# Altium footprint library SMotlaq-PCB_lib.PcbLib: 186 footprints (part 2 of 12)
Each footprint in its own frame and in the unit in brackets; x right, y up, seen from the top. Pads: shape width x height; smd on the part's side, far side on the other; paste and mask are expansions set on the pad; w line width, h text height; cw(c..) or ccw(c..) is an arc to the next point about the centre after c.
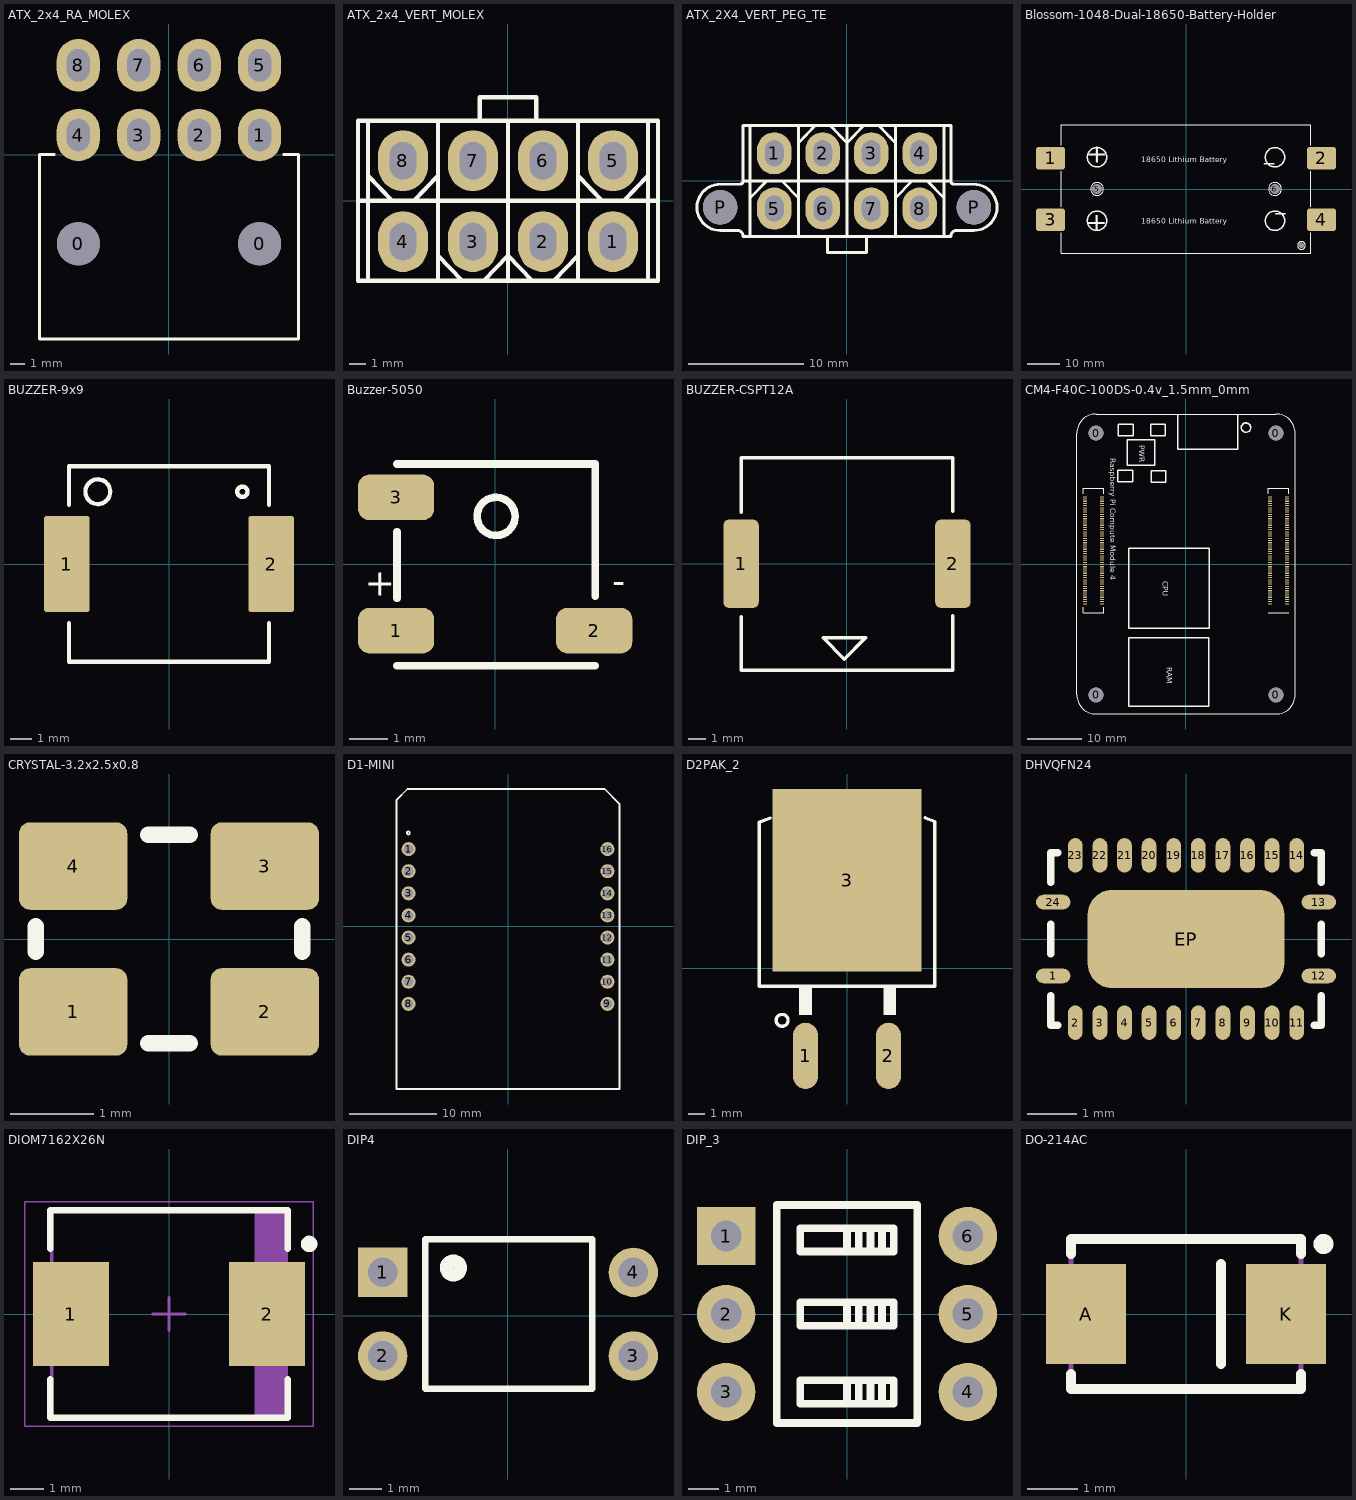
[diagram p1: the footprints below, top view; thin cyan lines are the x and y axes]

## ATX_2x4_RA_MOLEX [mm] "26013144   Mini-Fit Jr. Header, Dual Row, Right-Angle, with Snap-in Plastic Peg PCB Lock, 8 Circuits, PA Polyamide Nylon 6/6 94V-2, 1.27µm Select Gold (Au) Plating"
pads (10):
  round 3 hole 3 mask+0.05: 0(-6.299,-6.202) 0(6.301,-6.202)
  oval 3x3.65 hole 1.6 slot 2.25 at 90 deg: 1(6.299,1.352) 2(2.099,1.352) 3(-2.101,1.352) 4(-6.301,1.352) 5(6.299,6.202) 6(2.099,6.202) 7(-2.101,6.202) 8(-6.301,6.202)
Top Overlay:
  lines w0.2: -7.975,-0.002 -8.999,-0.002 -8.999,-12.821 9.001,-12.821 9.001,-0.002 7.976,-0.002
3D body "026013144.STEP": height 11.4, standoff -3.6, extent -8.999,-12.802 9.401,7.133

## ATX_2x4_VERT_MOLEX [mm] "26013144   Mini-Fit Jr. Header, Dual Row, Vertical, with Snap-in Plastic Peg PCB Lock, 8 Circuits, PA Polyamide Nylon 6/6 94V-2, 1.27µm Select Gold (Au) Plating"
pads (8):
  oval 3x3.65 hole 1.6 slot 2.25 at 90 deg: 1(6.3,-2.455) 2(2.1,-2.455) 3(-2.1,-2.455) 4(-6.3,-2.455) 5(6.3,2.395) 6(2.1,2.395) 7(-2.1,2.395) 8(-6.3,2.395)
Top Overlay:
  lines w0.254: -9,0 9,0 ; -8.4,-4.8 -8.4,4.8 ; -8.396,1.493 -6.961,0.006 ; -5.639,0.006 -4.204,1.493 ; -4.2,-4.8 -4.2,4.8 ; -4.199,-3.295 -2.752,-4.794 ; -1.7,4.8 -1.7,6.2 1.7,6.2 1.7,4.8 ; -1.448,-4.794 -0.001,-3.295 ; 0,-4.8 0,4.8 ; 0.001,-3.295 1.448,-4.794 ; 2.752,-4.794 4.199,-3.295 ; 4.2,-4.8 4.2,4.8 ; 4.204,1.493 5.639,0.006 ; 6.961,0.006 8.396,1.493 ; 8.4,-4.8 8.4,4.8 ; -9,-4.8 -9,4.8 9,4.8 9,-4.8 -9,-4.8
3D body "039281083.STEP": height 12.81, standoff -3.49, extent -9.4,-5 9.4,6

## ATX_2X4_VERT_PEG_TE [mm]
height 12.8
pads (10):
  oval 3x3.65 hole 1.6 slot 2.25 at 90 deg: 1(-6.3,2.395) 2(-2.1,2.395) 3(2.1,2.395) 4(6.3,2.395) 5(-6.3,-2.395) 6(-2.1,-2.395) 7(2.1,-2.395) 8(6.3,-2.395)
  round 3 hole 3 unplated mask+0.1: P(-11,-2.29) P(11,-2.29)
Top Overlay:
  lines w0.2: -9,0 -9,0 ; 9,0 9,0
  lines w0.254: -9,-4.8 4.2,-4.8 ; -9,-4.8 ccw(c-9.51,-4.8) -9.51,-4.29 -11,-4.29 cw(c-11,-2.29) -11,-0.29 -9.29,-0.29 ccw(c-9.29,0) -9,0 ; -8.4,-4.8 -8.4,4.8 ; -8.396,-1.493 -6.961,-0.006 ; -5.639,-0.006 -4.204,-1.493 ; -4.2,-4.8 -4.2,4.8 ; -4.199,3.295 -2.752,4.794 ; -1.7,-4.8 -1.7,-6.2 1.7,-6.2 1.7,-4.8 ; -1.448,4.794 -0.001,3.295 ; 0,-4.8 0,4.8 ; 0.001,3.295 1.448,4.794 ; 2.752,4.794 4.199,3.295 ; 4.2,4.8 4.2,-4.8 ; 4.204,-1.493 5.639,-0.006 ; 6.961,-0.006 8.396,-1.493 ; 8.4,-4.8 8.4,4.8 ; 4.2,-4.8 9,-4.8 cw(c9.51,-4.8) 9.51,-4.29 11,-4.29 ccw(c11,-2.29) 11,-0.29 9.29,-0.29 cw(c9.29,0) 9,0 ; 9,0 -9,0 -9,4.8 9,4.8 9,0
3D body "c-1586039-8-b-3d.stp": height 13, standoff -3.3, extent -12.15,-6.075 12.15,4.875

## Blossom-1048-Dual-18650-Battery-Holder [mm]
pads (7):
  rrect25% 9x7 smd: 1(-42.03,9.555) 2(42.03,9.555) 3(-42.03,-9.555) 4(42.03,-9.555)
  round 3 hole 3: 5(-27.6,0) 6(27.6,0)
  round 1.7 hole 1.7: 11(35.8,-17.5)
Top Overlay:
  circle w0.254: c-27.6,0 r2
  circle w0.254: c27.6,0 r2
  circle w0.254: c35.8,-17.5 r1.2
  circle w0.5: c-27.6,9.85 r3
  circle w0.5: c-27.6,-9.85 r3
  circle w0.5: c27.6,9.85 r3
  circle w0.5: c27.6,-9.85 r3
  lines w0.15: -38.725,-13.5 -38.725,-19.9 38.725,-19.9 38.725,-13.5 ; -38.725,-5.575 -38.725,5.575 ; -38.725,13.5 -38.725,19.9 38.725,19.9 38.725,13.5 ; 38.725,-5.575 38.725,5.575
  text "18650 Lithium Battery" at -13.823,-11.393 h3
  text "18650 Lithium Battery" at -13.823,7.717 h3
  text "_" at 24.299,7.566 h8
  text "+" at -24.299,-6.165 h10
  text "+" at -30.901,6.165 h10
  text "_" at 30.901,-7.566 h8
3D body "User Library-Blossom 1048.STEP": height 14.93, standoff -1.48, extent -43.002,-19.888 43.002,19.888

## BUZZER-9x9 [mm]
height 2
pads (2):
  rrect9% 2.1x4.4 smd: 1(-4.7,0) 2(4.7,0)
Top Overlay:
  circle w0.2: c3.375,3.325 r0.236
  circle w0.2: c-3.275,3.325 r0.57
  lines w0.2: -4.6,-2.725 -4.6,-4.5 4.6,-4.5 4.6,-2.725 ; -4.6,2.725 -4.6,4.5 4.6,4.5 4.6,2.725
3D body "User Library-Buzzer_CUI_CPT-9019S-SMT.step": height 2, standoff 0, extent -4.6,-4.5 4.6,4.5

## Buzzer-5050 [mm]
height 2
pads (3):
  rrect50% 2x1.2 smd: 1(-2.6,-1.75) 2(2.6,-1.75) 3(-2.6,1.75)
Top Overlay:
  circle w0.2: c0.025,1.25 r0.5
  lines w0.2: -2.575,-2.675 2.625,-2.675 ; -2.575,-0.9 -2.575,0.85 ; -2.575,2.625 2.625,2.625 2.625,-0.85
  text "-" at 3.075,-1.006 h1.2
  text "+" at -3.425,-1.074 h1.2
3D body "User Library-Beep_5020_SMT.step": height 2, standoff -0.01, extent -2.575,-2.6 2.625,2.6

## BUZZER-CSPT12A [mm]
height 1.5
pads (2):
  rrect30% 2x5 smd: 1(-6,0) 2(6,0)
Top Overlay:
  lines w0.2: -6,-3 -6,-6.025 6,-6.025 6,-2.95 ; -6,2.925 -6,6 6,6 6,2.975 ; -1.35,-4.2 1.05,-4.2 -0.15,-5.4 -1.35,-4.2
3D body "User Library-PKLCS1212_murata.step": height 3.07, standoff 0, extent -6,-6 6,6

## CM4-F40C-100DS-0.4v_1.5mm_0mm [mm] "DF40C-100DS-0.4v by Amornthep Phunsin"
pads (204):
  round 2.7 hole 2.7: 0(-16.5,-24) 0(-16.5,24) 0(16.5,-24) 0(16.5,24)
  rect 0.7x0.2 smd: 1(18.5,-7.3) 2(15.42,-7.3) 3(18.5,-6.9) 4(15.42,-6.9) 5(18.5,-6.5) 6(15.42,-6.5) 7(18.5,-6.1) 8(15.42,-6.1) 9(18.5,-5.7) 10(15.42,-5.7) 11(18.5,-5.3) 12(15.42,-5.3) 13(18.5,-4.9) 14(15.42,-4.9) 15(18.5,-4.5) 16(15.42,-4.5) 17(18.5,-4.1) 18(15.42,-4.1) 19(18.5,-3.7) 20(15.42,-3.7) 21(18.5,-3.3) 22(15.42,-3.3) 23(18.5,-2.9) 24(15.42,-2.9) 25(18.5,-2.5) 26(15.42,-2.5) 27(18.5,-2.1) 28(15.42,-2.1) 29(18.5,-1.7) 30(15.42,-1.7) 31(18.5,-1.3) 32(15.42,-1.3) 33(18.5,-0.9) 34(15.42,-0.9) 35(18.5,-0.5) 36(15.42,-0.5) 37(18.5,-0.1) 38(15.42,-0.1) 39(18.5,0.3) 40(15.42,0.3) 41(18.5,0.7) 42(15.42,0.7) 43(18.5,1.1) 44(15.42,1.1) 45(18.5,1.5) 46(15.42,1.5) 47(18.5,1.9) 48(15.42,1.9) 49(18.5,2.3) 50(15.42,2.3) 51(18.5,2.7) 52(15.42,2.7) 53(18.5,3.1) 54(15.42,3.1) 55(18.5,3.5) 56(15.42,3.5) 57(18.5,3.9) 58(15.42,3.9) 59(18.5,4.3) 60(15.42,4.3) 61(18.5,4.7) 62(15.42,4.7) 63(18.5,5.1) 64(15.42,5.1) 65(18.5,5.5) 66(15.42,5.5) 67(18.5,5.9) 68(15.42,5.9) 69(18.5,6.3) 70(15.42,6.3) 71(18.5,6.7) 72(15.42,6.7) 73(18.5,7.1) 74(15.42,7.1) 75(18.5,7.5) 76(15.42,7.5) 77(18.5,7.9) 78(15.42,7.9) 79(18.5,8.3) 80(15.42,8.3) 81(18.5,8.7) 82(15.42,8.7) 83(18.5,9.1) 84(15.42,9.1) 85(18.5,9.5) 86(15.42,9.5) 87(18.5,9.9) 88(15.42,9.9) 89(18.5,10.3) 90(15.42,10.3) 91(18.5,10.7) 92(15.42,10.7) 93(18.5,11.1) 94(15.42,11.1) 95(18.5,11.5) 96(15.42,11.5) 97(18.5,11.9) 98(15.42,11.9) 99(18.5,12.3) 100(15.42,12.3) 101(-15.42,-7.3) 102(-18.5,-7.3) 103(-15.42,-6.9) 104(-18.5,-6.9) 105(-15.42,-6.5) 106(-18.5,-6.5) 107(-15.42,-6.1) 108(-18.5,-6.1) 109(-15.42,-5.7) 110(-18.5,-5.7) 111(-15.42,-5.3) 112(-18.5,-5.3) 113(-15.42,-4.9) 114(-18.5,-4.9) 115(-15.42,-4.5) 116(-18.5,-4.5) 117(-15.42,-4.1) 118(-18.5,-4.1) 119(-15.42,-3.7) 120(-18.5,-3.7) 121(-15.42,-3.3) 122(-18.5,-3.3) 123(-15.42,-2.9) 124(-18.5,-2.9) 125(-15.42,-2.5) 126(-18.5,-2.5) 127(-15.42,-2.1) 128(-18.5,-2.1) 129(-15.42,-1.7) 130(-18.5,-1.7) 131(-15.42,-1.3) 132(-18.5,-1.3) 133(-15.42,-0.9) 134(-18.5,-0.9) 135(-15.42,-0.5) 136(-18.5,-0.5) 137(-15.42,-0.1) 138(-18.5,-0.1) 139(-15.42,0.3) 140(-18.5,0.3) 141(-15.42,0.7) 142(-18.5,0.7) 143(-15.42,1.1) 144(-18.5,1.1) 145(-15.42,1.5) 146(-18.5,1.5) 147(-15.42,1.9) 148(-18.5,1.9) 149(-15.42,2.3) 150(-18.5,2.3) 151(-15.42,2.7) 152(-18.5,2.7) 153(-15.42,3.1) 154(-18.5,3.1) 155(-15.42,3.5) 156(-18.5,3.5) 157(-15.42,3.9) 158(-18.5,3.9) 159(-15.42,4.3) 160(-18.5,4.3) 161(-15.42,4.7) 162(-18.5,4.7) 163(-15.42,5.1) 164(-18.5,5.1) 165(-15.42,5.5) 166(-18.5,5.5) 167(-15.42,5.9) 168(-18.5,5.9) 169(-15.42,6.3) 170(-18.5,6.3) 171(-15.42,6.7) 172(-18.5,6.7) 173(-15.42,7.1) 174(-18.5,7.1) 175(-15.42,7.5) 176(-18.5,7.5) 177(-15.42,7.9) 178(-18.5,7.9) 179(-15.42,8.3) 180(-18.5,8.3) 181(-15.42,8.7) 182(-18.5,8.7) 183(-15.42,9.1) 184(-18.5,9.1) 185(-15.42,9.5) 186(-18.5,9.5) 187(-15.42,9.9) 188(-18.5,9.9) 189(-15.42,10.3) 190(-18.5,10.3) 191(-15.42,10.7) 192(-18.5,10.7) 193(-15.42,11.1) 194(-18.5,11.1) 195(-15.42,11.5) 196(-18.5,11.5) 197(-15.42,11.9) 198(-18.5,11.9) 199(-15.42,12.3) 200(-18.5,12.3)
Top Overlay:
  circle w0.254: c11,25 r0.86
  lines w0.02: -1.5,24 -1.5,27.5 -1.5,21 9.5,21 9.5,27.5
  lines w0.12: -18.85,-7.9 -18.85,-8.9 -15.07,-8.9 ; -18.85,12.9 -18.85,13.9 -15.07,13.9 ; 15.07,-8.9 18.85,-8.9 ; 18.85,12.9 18.85,13.9 15.07,13.9 ; -15.07,-8.9 -15.07,-7.9 -15.07,-8.9 ; -15.07,13.9 -15.07,12.9 -15.07,13.9 ; 15.07,13.9 15.07,12.9 15.07,13.9 ; -20,-24 ccw(c-16.5,-24) -16.5,-27.5 16.5,-27.5 ccw(c16.5,-24) 20,-24 20,24 ccw(c16.5,24) 16.5,27.5 -16.5,27.5 ccw(c-16.5,24) -20,24 -20,-24
  lines w0.254: -1.5,24 -1.5,27.5 -1.5,21 9.5,21 9.5,27.5 ; -12.5,15.1 -9.8,15.1 -9.8,17.2 -12.5,17.2 -12.5,15.1 ; -12.4,23.5 -9.7,23.5 -9.7,25.6 -12.4,25.6 -12.4,23.5 ; -10.8,18.1 -10.8,22.8 -5.7,22.8 -5.7,18.1 -10.8,18.1 ; -10.5,-26.1 -10.5,-13.5 4.2,-13.5 4.2,-26.1 -10.5,-26.1 ; -10.5,-11.8 -10.5,2.9 4.3,2.9 4.3,-11.8 -10.5,-11.8 ; -6.5,23.5 -3.8,23.5 -3.8,25.6 -6.5,25.6 -6.5,23.5 ; -6.4,15 -3.7,15 -3.7,17.1 -6.4,17.1 -6.4,15
  text "PWR" at -8.602,21.761 h1
  text "RAM" at -3.546,-18.954 h1
  text "CPU" at -4.246,-3.154 h1
  text "Raspberry Pi Compute Module 4" at -13.913,19.346 h1
3D body "cm4-rev1-3_new.STEP": height 5.15, standoff 0.37, extent -20,-27.5 20,27.5
3D body "DF40C-100DS.stp": height 1.4, standoff -0.05, extent 15.31,-8.785 18.69,13.815
3D body "DF40C-100DS.stp": height 1.4, standoff -0.05, extent -18.69,-8.785 -15.31,13.815

## CRYSTAL-3.2x2.5x0.8 [mm]
height 0.8
pads (4):
  rrect25% 1.3x1.05 smd mask+0.075: 1(-1.15,-0.875) 2(1.15,-0.875) 3(1.15,0.875) 4(-1.15,0.875)
Top Overlay:
  lines w0.2: -1.6,-0.15 -1.6,0.15 ; -0.25,-1.25 0.25,-1.25 ; -0.25,1.25 0.25,1.25 ; 1.6,-0.15 1.6,0.15
3D body "User Library-ECX-32.step": height 0.78, standoff -0.03, extent -1.601,-1.251 1.601,1.251

## D1-MINI [mm]
pads (16):
  round 1.61 hole 1.11: 1(-11.43,8.89) 2(-11.43,6.35) 3(-11.43,3.81) 4(-11.43,1.27) 5(-11.43,-1.27) 6(-11.43,-3.81) 7(-11.43,-6.35) 8(-11.43,-8.89) 9(11.43,-8.89) 10(11.43,-6.35) 11(11.43,-3.81) 12(11.43,-1.27) 13(11.43,1.27) 14(11.43,3.81) 15(11.43,6.35) 16(11.43,8.89)
Top Overlay:
  circle w0.2: c-11.45,10.75 r0.174
  lines w0.2: -12.8,-18.675 12.8,-18.675 12.8,14.1 11.1,15.8 -11.55,15.8 -12.8,14.55 -12.8,-18.675
3D body "User Library-WeMos2.STEP": height 10.1, standoff -2, extent -12.7,-18.658 12.65,15.758

## D2PAK_2 [mm] "D2PAK-3, FMG500_3_S1000"
height 4.4
pads (3):
  oval 1.5x4 smd: 1(-2.5,-5.3) 2(2.5,-5.3)
  rect 9x11 smd paste-5: 3(0,5.3)
Top Overlay:
  circle w0.2: c-3.915,-3.16 r0.359
  rectangle: 2.199,-2.849 2.961,-1.125
  rectangle: -2.881,-2.849 -2.119,-1.125
  lines w0.2: -4.618,9.052 -5.3,8.794 -5.3,-1.1 5.3,-1.1 5.3,8.839 4.724,9.058
Top Paste:
  region: -0.2,2.4 -1.2,2.4 -1.2,1.4 -0.2,1.4
  rectangle: -4,1.4 -3,2.4
  region: -0.2,2.8 -0.2,3.8 -1.2,3.8 -1.2,2.8
  region: -3,0 -3,1 -4,1 -4,0
  rectangle: -4,2.8 -3,3.8
  rectangle: -2.6,1.4 -1.6,2.4
  rectangle: -1.2,0 -0.2,1
  region: -1.6,0 -1.6,1 -2.6,1 -2.6,0
  region: -2.6,3.8 -2.6,2.8 -1.6,2.8 -1.6,3.8
  region: -2.6,8 -2.6,7 -1.6,7 -1.6,8
  region: -1.6,4.2 -1.6,5.2 -2.6,5.2 -2.6,4.2
  rectangle: -1.2,4.2 -0.2,5.2
  rectangle: -2.6,5.6 -1.6,6.6
  rectangle: -4,7 -3,8
  region: -3,4.2 -3,5.2 -4,5.2 -4,4.2
  region: -0.2,7 -0.2,8 -1.2,8 -1.2,7
  rectangle: -4,5.6 -3,6.6
  region: -0.2,6.6 -1.2,6.6 -1.2,5.6 -0.2,5.6
  region: -0.2,9.4 -1.2,9.4 -1.2,8.4 -0.2,8.4
  rectangle: -4,8.4 -3,9.4
  rectangle: -2.6,8.4 -1.6,9.4
  region: 2.6,9.4 1.6,9.4 1.6,8.4 2.6,8.4
  region: 4,9.4 3,9.4 3,8.4 4,8.4
  rectangle: 0.2,8.4 1.2,9.4
  rectangle: 0.2,5.6 1.2,6.6
  region: 4,6.6 3,6.6 3,5.6 4,5.6
  region: 1.2,7 1.2,8 0.2,8 0.2,7
  region: 4,4.2 4,5.2 3,5.2 3,4.2
  region: 4,8 3,8 3,7 4,7
  region: 2.6,6.6 1.6,6.6 1.6,5.6 2.6,5.6
  region: 1.2,5.2 0.2,5.2 0.2,4.2 1.2,4.2
  region: 2.6,4.2 2.6,5.2 1.6,5.2 1.6,4.2
  region: 1.6,8 1.6,7 2.6,7 2.6,8
  region: 1.6,3.8 1.6,2.8 2.6,2.8 2.6,3.8
  region: 2.6,0 2.6,1 1.6,1 1.6,0
  region: 1.2,1 0.2,1 0.2,0 1.2,0
  region: 2.6,2.4 1.6,2.4 1.6,1.4 2.6,1.4
  region: 4,3.8 3,3.8 3,2.8 4,2.8
  region: 4,0 4,1 3,1 3,0
  region: 1.2,2.8 1.2,3.8 0.2,3.8 0.2,2.8
  region: 4,2.4 3,2.4 3,1.4 4,1.4
  rectangle: 0.2,1.4 1.2,2.4
3D body "User Library-D2PAK.step": height 4.83, standoff 0, extent -5.335,-6.1 5.335,9.78

## DHVQFN24 [mm]
height 1
pads (31):
  rrect100% 0.7x0.3 smd mask+0.1: 1(-2.7,-0.75) 12(2.7,-0.75) 13(2.7,0.75) 24(-2.7,0.75)
  rrect100% 0.3x0.7 smd mask+0.1: 2(-2.25,-1.7) 3(-1.75,-1.7) 4(-1.25,-1.7) 5(-0.75,-1.7) 6(-0.25,-1.7) 7(0.25,-1.7) 8(0.75,-1.7) 9(1.25,-1.7) 10(1.75,-1.7) 11(2.25,-1.7) 14(2.25,1.7) 15(1.75,1.7) 16(1.25,1.7) 17(0.75,1.7) 18(0.25,1.7) 19(-0.25,1.7) 20(-0.75,1.7) 21(-1.25,1.7) 22(-1.75,1.7) 23(-2.25,1.7)
  rrect50% 4x2 smd paste-2539.97 mask+0.1: EP(0,0)
  rrect10% 1x0.6 on Top Paste mask+0.1: ""(-1.25,-0.45) ""(-1.25,0.45) ""(0,-0.45) ""(0,0.45) ""(1.25,-0.45) ""(1.25,0.45)
Top Overlay:
  lines w0.15: -2.75,-1.15 -2.75,-1.75 -2.604,-1.75 ; -2.75,-0.3 -2.75,0.3 ; -2.75,1.15 -2.75,1.75 -2.604,1.75 ; 2.604,-1.75 2.75,-1.75 2.75,-1.15 ; 2.604,1.75 2.75,1.75 2.75,1.15 ; 2.75,-0.3 2.75,0.3
3D body "74HC154BQ,118.stp": height 0.85, standoff 0, extent -2.75,-1.75 2.75,1.75

## DIOM7162X26N [mm] "Molded Diode, 2-Leads, Body 7.11x6.22mm, IPC Medium Density"
height 2.62
pads (2):
  rect 2.3x3.15 smd: 1(-2.975,0) 2(2.975,0)
Top Overlay:
  circle w0.25: c4.25,2.125 r0.125
  lines w0.2: -3.6,-1.975 -3.6,-3.15 3.6,-3.15 3.6,-1.975 ; -3.6,1.975 -3.6,3.15 3.6,3.15 3.6,1.975
Mechanical 13:
  rectangle: 2.599,-3.11 3.555,3.11
  lines w0.1: -3.555,-3.11 -3.555,3.11 3.555,3.11 3.555,-3.11 -3.555,-3.11
Mechanical 15:
  lines w0.05: -4.375,-3.4 -4.375,3.4 4.375,3.4 4.375,-3.4 -4.375,-3.4
  lines w0.1: -0.5,0 0.5,0 ; 0,-0.5 0,0.5
3D body "User Library-DIOM8261X24.step": height 2.4, standoff 0.03, extent -4.065,-3.05 4.065,3.05

## DIP4 [mm]
pads (4):
  rect 1.5x1.5 hole 0.9: 1(-3.8,1.315)
  round 1.5 hole 0.9: 2(-3.8,-1.225) 3(3.82,-1.225) 4(3.82,1.315)
Top Overlay:
  lines w0.2: -2.5,-2.225 2.575,-2.225 2.575,2.325 -2.5,2.325 -2.5,-2.225
  lines w0.4: -1.442,1.492 ccw(c-1.65,1.45) -1.438,1.45
3D body "User Library-DIP4.STEP": height 3.75, standoff -2.55, extent -3.925,-2.252 3.945,2.342

## DIP_3 [mm]
pads (6):
  rect 1.9x1.9 hole 1: 1(-3.937,2.54)
  round 1.9 hole 1: 2(-3.937,0) 3(-3.937,-2.54) 4(3.937,-2.54) 5(3.937,0) 6(3.937,2.54)
Top Overlay:
  lines w0.254: 0,-2.921 0,-2.159 ; 0,-0.381 0,0.381 ; 0,2.032 0,2.794 ; 0.381,-2.921 0.381,-2.159 ; 0.381,-0.381 0.381,0.381 ; 0.381,2.032 0.381,2.794 ; 0.762,-2.921 0.762,-2.159 ; 0.762,-0.381 0.762,0.381 ; 0.762,2.032 0.762,2.794 ; 1.143,-2.921 1.143,-2.159 ; 1.143,-0.381 1.143,0.381 ; 1.143,2.032 1.143,2.794 ; -2.286,-3.556 2.286,-3.556 2.286,3.556 -2.286,3.556 -2.286,-3.556 ; -1.524,-2.921 -1.524,-2.159 1.524,-2.159 1.524,-2.921 -1.524,-2.921 ; -1.524,-0.381 -1.524,0.381 1.524,0.381 1.524,-0.381 -1.524,-0.381 ; -1.524,2.032 -1.524,2.794 1.524,2.794 1.524,2.032 -1.524,2.032
3D body "switch_ad-dil-sw_03-n.stp": height 6.3, standoff -4, extent -4.8,-4.31 4.8,4.31

## DO-214AC [mm]
pads (2):
  rect 1.6x2 smd: A(-2,0) K(2,0)
Top Overlay:
  circle w0.2: c2.75,1.4 r0.1
  lines w0.2: -2.3,-1.2 -2.3,-1.5 2.3,-1.5 2.3,-1.2 ; -2.3,1.2 -2.3,1.5 2.3,1.5 2.3,1.2 ; 0.7,-1 0.7,1
Mechanical 13:
  lines w0.1: -2.3,-0.7 -2.6,-0.7 -2.6,0.7 -2.3,0.7 ; 2.3,-0.7 2.6,-0.7 2.6,0.7 2.3,0.7 ; -2.3,-1.5 2.3,-1.5 2.3,1.5 -2.3,1.5 -2.3,-1.5
3D body: height 1, standoff 0, extent -2.599,-0.699 -2.301,0.699
3D body: height 1, standoff 0, extent 2.301,-0.699 2.599,0.699
3D body: height 2.5, standoff 0, extent -2.299,-1.499 2.299,1.499